# Altium footprint library Indruino.PcbLib: 383 footprints (part 14 of 24)
Each footprint in its own frame and in the unit in brackets; x right, y up, seen from the top. Pads: shape width x height; smd on the part's side, far side on the other; paste and mask are expansions set on the pad; w line width, h text height; cw(c..) or ccw(c..) is an arc to the next point about the centre after c.
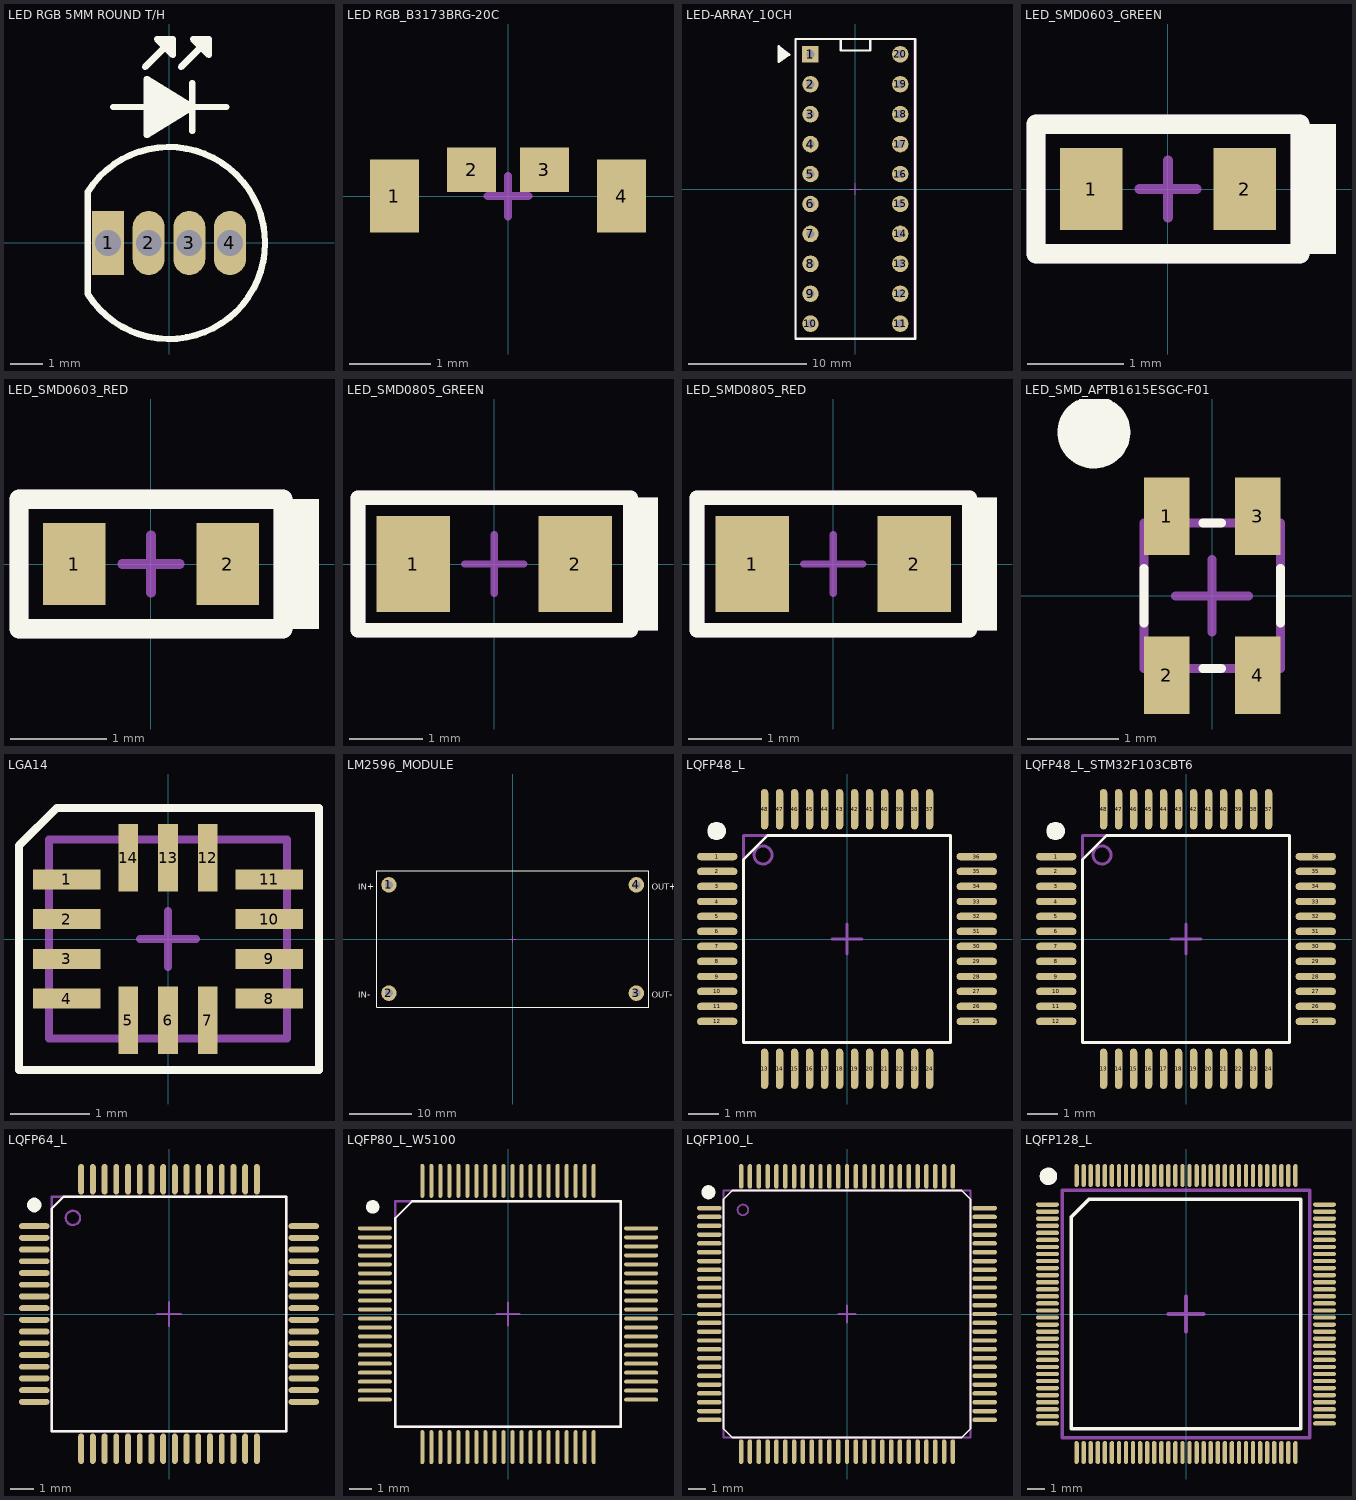
[diagram p13: the footprints below, top view; thin cyan lines are the x and y axes]

## LED RGB 5MM ROUND T/H [mm]
pads (4):
  rect 1x2 hole 0.8: 1(-1.905,0)
  oval 1x2 hole 0.8: 2(-0.635,0) 3(0.635,0) 4(1.905,0)
Top Overlay:
  region: 0.75,6.375 1.25,6.375 1.25,5.875
  region: 0.125,5.875 -0.375,6.375 0.125,6.375
  region: -0.689,3.375 0.725,4.25 -0.689,5.125
  lines w0.2: -2.541,-1.594 ccw(c0,0) -2.538,1.599 ; -2.54,-1.594 -2.54,1.599 ; -1.75,4.25 -0.689,4.25 ; -0.75,5.5 0.125,6.375 ; 0.375,5.5 1.25,6.375 ; 0.725,3.5 0.725,5 ; 1.786,4.25 0.725,4.25 ; 0.125,6.375 0.125,5.875 -0.375,6.375 0.125,6.375 ; 0.725,4.25 -0.689,5.125 -0.689,3.375 0.725,4.25 ; 1.25,6.375 0.75,6.375 1.25,5.875 1.25,6.375
3D body "WP154A4.STEP": height 13.6, standoff -19.5, extent -2.5,-2.95 2.95,2.95

## LED RGB_B3173BRG-20C [mm] "Harvatek, ARGB SMD Chip LED, Size 1204, Side View, Body 3.2x1.0x1.5mm,"
height 1
pads (4):
  rect 0.6x0.9 smd: 1(-1.4,0) 4(1.4,0)
  rect 0.6x0.55 smd: 2(-0.45,0.325) 3(0.45,0.325)
Mechanical 15:
  lines w0.1: -0.25,0 0.25,0 ; 0,-0.25 0,0.25
3D body "LED_HARVATEK_B3173BRG-20C.STEP": height 1, standoff 0, extent -1.7,-1.35 1.7,0.45

## LED-ARRAY_10CH [mm] "DIP, 20-Pin, Row Spacing 7.62 mm, Pitch 2.54 mm"
height 5.08
pads (20):
  rect 1.4x1.4 hole 0.7: 1(-3.81,11.43)
  round 1.4 hole 0.7: 2(-3.81,8.89) 3(-3.81,6.35) 4(-3.81,3.81) 5(-3.81,1.27) 6(-3.81,-1.27) 7(-3.81,-3.81) 8(-3.81,-6.35) 9(-3.81,-8.89) 10(-3.81,-11.43) 11(3.81,-11.43) 12(3.81,-8.89) 13(3.81,-6.35) 14(3.81,-3.81) 15(3.81,-1.27) 16(3.81,1.27) 17(3.81,3.81) 18(3.81,6.35) 19(3.81,8.89) 20(3.81,11.43)
Top Overlay:
  region: -6.5,12.1 -5.6,11.4 -6.5,10.8
  lines w0.2: -1.25,12.73 -1.25,11.75 1.25,11.75 1.25,12.73 ; -6.5,10.8 -6.5,12.1 -5.6,11.4 -6.5,10.8 ; -5.08,-12.7 5.08,-12.7 5.08,12.73 -5.08,12.73 -5.08,-12.7
Mechanical 1:
  lines w0.1: -5,-12.73 5,-12.73 5,12.73 -5,12.73 -5,-12.73
Mechanical 15:
  lines w0.1: -0.5,0 0.5,0 ; 0,-0.5 0,0.5
3D body "User Library-LED_BAR_10.step": height 11.8, standoff -2, extent -5.08,-12.7 5.08,12.7

## LED_SMD0603_GREEN [mm]
pads (2):
  rect 0.65x0.85 smd: 1(-0.8,0) 2(0.8,0)
Top Overlay:
  region: 1.75,0.675 1.375,0.675 1.375,-0.675 1.75,-0.675
  lines w0.2: -1.375,-0.675 -1.375,0.675 1.375,0.675 1.375,-0.675 -1.375,-0.675
Mechanical 13:
  region: 1.75,0.675 1.375,0.675 1.375,-0.675 1.75,-0.675
  lines w0.2: -1.375,-0.675 -1.375,0.675 1.375,0.675 1.375,-0.675 -1.375,-0.675
  text "'.Designator'" at -1.03,-0.397 h0.7
Mechanical 15:
  lines w0.1: -0.3,0 0.3,0 ; 0,-0.3 0,0.3
3D body "User Library-LTST-C190GKT.STEP": height 0.9, standoff 0, extent -0.85,-0.45 0.85,0.45

## LED_SMD0603_RED [mm]
pads (2):
  rect 0.65x0.85 smd: 1(-0.8,0) 2(0.8,0)
Top Overlay:
  region: 1.75,0.675 1.375,0.675 1.375,-0.675 1.75,-0.675
  lines w0.2: -1.375,-0.675 -1.375,0.675 1.375,0.675 1.375,-0.675 -1.375,-0.675
Mechanical 13:
  region: 1.75,0.675 1.375,0.675 1.375,-0.675 1.75,-0.675
  lines w0.2: -1.375,-0.675 -1.375,0.675 1.375,0.675 1.375,-0.675 -1.375,-0.675
  text "'.Designator'" at -1.03,-0.397 h0.7
Mechanical 15:
  lines w0.1: -0.3,0 0.3,0 ; 0,-0.3 0,0.3
3D body "User Library-LTST-C190EKT.STEP": height 0.9, standoff 0, extent -0.855,-0.45 0.845,0.45

## LED_SMD0805_GREEN [mm]
pads (2):
  rect 1x1.3 smd: 1(-1.1,0) 2(1.1,0)
Top Overlay:
  region: 2.225,0.9 1.85,0.9 1.85,-0.9 2.225,-0.9
  lines w0.2: -1.85,-0.9 1.85,-0.9 1.85,0.9 -1.85,0.9 -1.85,-0.9
Mechanical 13:
  region: 2.225,0.9 1.85,0.9 1.85,-0.9 2.225,-0.9
  lines w0.2: -1.85,-0.9 -1.85,0.9 1.85,0.9 1.85,-0.9 -1.85,-0.9
  text "'.Designator'" at -1.43,-0.297 h0.7
Mechanical 15:
  lines w0.1: -0.4,0 0.4,0 ; 0,-0.4 0,0.4
3D body "led_smd_2012_green.stp": height 0.9, standoff 0, extent -1.195,-0.75 1.205,0.75

## LED_SMD0805_RED [mm]
pads (2):
  rect 1x1.3 smd: 1(-1.1,0) 2(1.1,0)
Top Overlay:
  region: 2.225,0.9 1.85,0.9 1.85,-0.9 2.225,-0.9
  lines w0.2: -1.85,-0.9 -1.85,0.9 1.85,0.9 1.85,-0.9 -1.85,-0.9
Mechanical 13:
  region: 2.225,0.9 1.85,0.9 1.85,-0.9 2.225,-0.9
  lines w0.2: -1.85,-0.9 1.85,-0.9 1.85,0.9 -1.85,0.9 -1.85,-0.9
  text "'.Designator'" at -1.43,-0.297 h0.7
Mechanical 15:
  lines w0.1: -0.4,0 0.4,0 ; 0,-0.4 0,0.4
3D body "everlight-17-21-0805LED-red.step": height 1.12, standoff 0.01, extent -1,-0.625 1,0.625

## LED_SMD_APTB1615ESGC-F01 [mm] "1.6mmx1.5mm SMT LED, 0.7mm thickness."
height 0.45
pads (4):
  rect 0.5x0.85 smd: 1(-0.5,0.875) 2(-0.5,-0.875) 3(0.5,0.875) 4(0.5,-0.875)
Top Overlay:
  circle w0.4: c-1.3,1.8 r0.2
  lines w0.1: -0.75,-0.3 -0.75,0.3 ; -0.1,-0.8 0.1,-0.8 ; -0.1,0.8 0.1,0.8 ; 0.75,-0.3 0.75,0.3
Mechanical 15:
  lines w0.1: -0.4,0 0.4,0 ; 0,-0.4 0,0.4 ; -0.75,-0.8 0.75,-0.8 0.75,0.8 -0.75,0.8 -0.75,-0.8
3D body "APTB1615.STEP": height 0.68, standoff -0.02, extent -0.75,-0.8 0.75,0.8

## LGA14 [mm] "LGA14 LEAD 2.5x3x0.83mm"
height 0.83
pads (14):
  rect 0.85x0.25 smd: 1(-1.275,0.75) 2(-1.275,0.25) 3(-1.275,-0.25) 4(-1.275,-0.75) 8(1.275,-0.75) 9(1.275,-0.25) 10(1.275,0.25) 11(1.275,0.75)
  rect 0.25x0.85 smd: 5(-0.5,-1.025) 6(0,-1.025) 7(0.5,-1.025) 12(0.5,1.025) 13(0,1.025) 14(-0.5,1.025)
Top Overlay:
  lines w0.1: -1.875,-1.65 -1.875,1.175 -1.4,1.65 1.9,1.65 1.9,-1.65 -1.875,-1.65
Mechanical 13:
  lines w0.1: -1.5,-1.25 -1.5,1.25 1.5,1.25 1.5,-1.25 -1.5,-1.25
Mechanical 15:
  lines w0.1: -0.35,0 0.35,0 ; 0,-0.35 0,0.35
3D body: height 0.86, standoff 0, extent -1.5,-1.25 1.5,1.25

## LM2596_MODULE [mm]
pads (4):
  round 2.5 hole 1.3: 1(-20,8.75) 2(-20,-8.75) 3(20,-8.75) 4(20,8.75)
Top Overlay:
  lines w0.2: -22,-11 -22,11 22,11 22,-11 -22,-11
  text "OUT-" at 22.5,-9.5 h1
  text "OUT+" at 22.5,8 h1
  text "IN-" at -25,-9.5 h1
  text "IN+" at -25,8 h1
Mechanical 15:
  lines w0.1: -0.5,0 0.5,0 ; 0,-0.5 0,0.5
3D body: height 10, standoff 0, extent -22,-11 22,11

## LQFP48_L [mm] "Thin QFP, 48-Leads, Body 7x7mm, Pitch 0.5mm, IPC High Density"
height 1.6
pads (48):
  oval 1.35x0.25 smd: 1(-4.325,2.75) 2(-4.325,2.25) 3(-4.325,1.75) 4(-4.325,1.25) 5(-4.325,0.75) 6(-4.325,0.25) 7(-4.325,-0.25) 8(-4.325,-0.75) 9(-4.325,-1.25) 10(-4.325,-1.75) 11(-4.325,-2.25) 12(-4.325,-2.75) 25(4.325,-2.75) 26(4.325,-2.25) 27(4.325,-1.75) 28(4.325,-1.25) 29(4.325,-0.75) 30(4.325,-0.25) 31(4.325,0.25) 32(4.325,0.75) 33(4.325,1.25) 34(4.325,1.75) 35(4.325,2.25) 36(4.325,2.75)
  oval 0.25x1.35 smd: 13(-2.75,-4.325) 14(-2.25,-4.325) 15(-1.75,-4.325) 16(-1.25,-4.325) 17(-0.75,-4.325) 18(-0.25,-4.325) 19(0.25,-4.325) 20(0.75,-4.325) 21(1.25,-4.325) 22(1.75,-4.325) 23(2.25,-4.325) 24(2.75,-4.325) 37(2.75,4.325) 38(2.25,4.325) 39(1.75,4.325) 40(1.25,4.325) 41(0.75,4.325) 42(0.25,4.325) 43(-0.25,4.325) 44(-0.75,4.325) 45(-1.25,4.325) 46(-1.75,4.325) 47(-2.25,4.325) 48(-2.75,4.325)
Top Overlay:
  region: -4.35,3.3 -4.41,3.3 -4.52,3.346 -4.604,3.43 -4.65,3.54 -4.65,3.6 -4.65,3.66 -4.604,3.77 -4.52,3.854 -4.41,3.9 -4.35,3.9 -4.29,3.9 -4.18,3.854 -4.096,3.77 -4.05,3.66 -4.05,3.6 -4.05,3.54 -4.096,3.43 -4.18,3.346 -4.29,3.3
  lines w0.1: -3.45,-3.45 -3.45,2.65 -2.65,3.45 3.45,3.45 3.45,-3.45 -3.45,-3.45
Mechanical 13:
  circle w0.1: c-2.8,2.8 r0.3
  lines w0.1: -3.45,-3.45 -3.45,3.45 3.45,3.45 3.45,-3.45 -3.45,-3.45
Mechanical 15:
  lines w0.1: -0.5,0 0.5,0 ; 0,-0.5 0,0.5
3D body "User Library-LQFP48-0_5.STEP": height 1.6, standoff 0.03, extent -4.392,-4.382 4.38,4.39

## LQFP48_L_STM32F103CBT6 [mm] "Thin QFP, 48-Leads, Body 7x7mm, Pitch 0.5mm, IPC High Density"
height 1.6
pads (48):
  oval 1.35x0.25 smd: 1(-4.325,2.75) 2(-4.325,2.25) 3(-4.325,1.75) 4(-4.325,1.25) 5(-4.325,0.75) 6(-4.325,0.25) 7(-4.325,-0.25) 8(-4.325,-0.75) 9(-4.325,-1.25) 10(-4.325,-1.75) 11(-4.325,-2.25) 12(-4.325,-2.75) 25(4.325,-2.75) 26(4.325,-2.25) 27(4.325,-1.75) 28(4.325,-1.25) 29(4.325,-0.75) 30(4.325,-0.25) 31(4.325,0.25) 32(4.325,0.75) 33(4.325,1.25) 34(4.325,1.75) 35(4.325,2.25) 36(4.325,2.75)
  oval 0.25x1.35 smd: 13(-2.75,-4.325) 14(-2.25,-4.325) 15(-1.75,-4.325) 16(-1.25,-4.325) 17(-0.75,-4.325) 18(-0.25,-4.325) 19(0.25,-4.325) 20(0.75,-4.325) 21(1.25,-4.325) 22(1.75,-4.325) 23(2.25,-4.325) 24(2.75,-4.325) 37(2.75,4.325) 38(2.25,4.325) 39(1.75,4.325) 40(1.25,4.325) 41(0.75,4.325) 42(0.25,4.325) 43(-0.25,4.325) 44(-0.75,4.325) 45(-1.25,4.325) 46(-1.75,4.325) 47(-2.25,4.325) 48(-2.75,4.325)
Top Overlay:
  region: -4.35,3.3 -4.41,3.3 -4.52,3.346 -4.604,3.43 -4.65,3.54 -4.65,3.6 -4.65,3.66 -4.604,3.77 -4.52,3.854 -4.41,3.9 -4.35,3.9 -4.29,3.9 -4.18,3.854 -4.096,3.77 -4.05,3.66 -4.05,3.6 -4.05,3.54 -4.096,3.43 -4.18,3.346 -4.29,3.3
  lines w0.1: -3.45,-3.45 -3.45,2.65 -2.65,3.45 3.45,3.45 3.45,-3.45 -3.45,-3.45
Mechanical 13:
  circle w0.1: c-2.8,2.8 r0.3
  lines w0.1: -3.45,-3.45 -3.45,3.45 3.45,3.45 3.45,-3.45 -3.45,-3.45
Mechanical 15:
  lines w0.1: -0.5,0 0.5,0 ; 0,-0.5 0,0.5
3D body "STM32 LQFP48.step": height 1.5, standoff 0, extent -4.5,-4.509 4.518,4.509

## LQFP64_L [mm]
pads (64):
  oval 1.3x0.25 smd: 1(-5.75,3.75) 2(-5.75,3.25) 3(-5.75,2.75) 4(-5.75,2.25) 5(-5.75,1.75) 6(-5.75,1.25) 7(-5.75,0.75) 8(-5.75,0.25) 9(-5.75,-0.25) 10(-5.75,-0.75) 11(-5.75,-1.25) 12(-5.75,-1.75) 13(-5.75,-2.25) 14(-5.75,-2.75) 15(-5.75,-3.25) 16(-5.75,-3.75) 33(5.75,-3.75) 34(5.75,-3.25) 35(5.75,-2.75) 36(5.75,-2.25) 37(5.75,-1.75) 38(5.75,-1.25) 39(5.75,-0.75) 40(5.75,-0.25) 41(5.75,0.25) 42(5.75,0.75) 43(5.75,1.25) 44(5.75,1.75) 45(5.75,2.25) 46(5.75,2.75) 47(5.75,3.25) 48(5.75,3.75)
  oval 0.25x1.3 smd: 17(-3.75,-5.75) 18(-3.25,-5.75) 19(-2.75,-5.75) 20(-2.25,-5.75) 21(-1.75,-5.75) 22(-1.25,-5.75) 23(-0.75,-5.75) 24(-0.25,-5.75) 25(0.25,-5.75) 26(0.75,-5.75) 27(1.25,-5.75) 28(1.75,-5.75) 29(2.25,-5.75) 30(2.75,-5.75) 31(3.25,-5.75) 32(3.75,-5.75) 49(3.75,5.75) 50(3.25,5.75) 51(2.75,5.75) 52(2.25,5.75) 53(1.75,5.75) 54(1.25,5.75) 55(0.75,5.75) 56(0.25,5.75) 57(-0.25,5.75) 58(-0.75,5.75) 59(-1.25,5.75) 60(-1.75,5.75) 61(-2.25,5.75) 62(-2.75,5.75) 63(-3.25,5.75) 64(-3.75,5.75)
Top Overlay:
  region: -5.75,4.35 -5.81,4.35 -5.92,4.396 -6.004,4.48 -6.05,4.59 -6.05,4.65 -6.05,4.71 -6.004,4.82 -5.92,4.904 -5.81,4.95 -5.75,4.95 -5.69,4.95 -5.58,4.904 -5.496,4.82 -5.45,4.71 -5.45,4.65 -5.45,4.59 -5.496,4.48 -5.58,4.396 -5.69,4.35
  lines w0.1: -5,-5 -5,4.5 -4.5,5 5,5 5,-5 -5,-5
Mechanical 13:
  circle w0.1: c-4.1,4.1 r0.304
  lines w0.1: -5,-5 5,-5 5,5 -5,5 -5,-5
Mechanical 15:
  lines w0.1: -0.5,0 0.5,0 ; 0,-0.5 0,0.5
3D body "User Library-LQFP64-0_5.STEP": height 1.6, standoff 0.03, extent -5.896,-5.896 5.876,5.876

## LQFP80_L_W5100 [mm]
pads (80):
  oval 1.5x0.18 smd: 1(-5.9,3.8) 2(-5.9,3.4) 3(-5.9,3) 4(-5.9,2.6) 5(-5.9,2.2) 6(-5.9,1.8) 7(-5.9,1.4) 8(-5.9,1) 9(-5.9,0.6) 10(-5.9,0.2) 11(-5.9,-0.2) 12(-5.9,-0.6) 13(-5.9,-1) 14(-5.9,-1.4) 15(-5.9,-1.8) 16(-5.9,-2.2) 17(-5.9,-2.6) 18(-5.9,-3) 19(-5.9,-3.4) 20(-5.9,-3.8) 41(5.9,-3.8) 42(5.9,-3.4) 43(5.9,-3) 44(5.9,-2.6) 45(5.9,-2.2) 46(5.9,-1.8) 47(5.9,-1.4) 48(5.9,-1) 49(5.9,-0.6) 50(5.9,-0.2) 51(5.9,0.2) 52(5.9,0.6) 53(5.9,1) 54(5.9,1.4) 55(5.9,1.8) 56(5.9,2.2) 57(5.9,2.6) 58(5.9,3) 59(5.9,3.4) 60(5.9,3.8)
  oval 0.18x1.5 smd: 21(-3.8,-5.9) 22(-3.4,-5.9) 23(-3,-5.9) 24(-2.6,-5.9) 25(-2.2,-5.9) 26(-1.8,-5.9) 27(-1.4,-5.9) 28(-1,-5.9) 29(-0.6,-5.9) 30(-0.2,-5.9) 31(0.2,-5.9) 32(0.6,-5.9) 33(1,-5.9) 34(1.4,-5.9) 35(1.8,-5.9) 36(2.2,-5.9) 37(2.6,-5.9) 38(3,-5.9) 39(3.4,-5.9) 40(3.8,-5.9) 61(3.8,5.9) 62(3.4,5.9) 63(3,5.9) 64(2.6,5.9) 65(2.2,5.9) 66(1.8,5.9) 67(1.4,5.9) 68(1,5.9) 69(0.6,5.9) 70(0.2,5.9) 71(-0.2,5.9) 72(-0.6,5.9) 73(-1,5.9) 74(-1.4,5.9) 75(-1.8,5.9) 76(-2.2,5.9) 77(-2.6,5.9) 78(-3,5.9) 79(-3.4,5.9) 80(-3.8,5.9)
Top Overlay:
  circle w0.2: c-6,4.75 r0.2
  region: -6,4.55 -6.04,4.55 -6.113,4.58 -6.17,4.637 -6.2,4.71 -6.2,4.75 -6.2,4.79 -6.17,4.863 -6.113,4.92 -6.04,4.95 -6,4.95 -5.96,4.95 -5.887,4.92 -5.83,4.863 -5.8,4.79 -5.8,4.75 -5.8,4.71 -5.83,4.637 -5.887,4.58 -5.96,4.55
  lines w0.1: -5,-5 -5,4.25 -4.25,5 5,5 5,-5 -5,-5
Mechanical 13:
  lines w0.1: -5,-5 -5,5 5,5 5,-5 -5,-5
Mechanical 15:
  lines w0.1: -0.5,0 0.5,0 ; 0,-0.5 0,0.5
3D body "User Library-LQFP-80-2.step": height 1.75, standoff 0, extent -6,-6.002 6.005,6.002

## LQFP100_L [mm] "Thin QFP, 100-Leads, Body 14x14mm, Pitch 0.5mm, IPC High Density"
height 1.6
pads (100):
  oval 1.4x0.25 smd: 1(-7.8,6) 2(-7.8,5.5) 3(-7.8,5) 4(-7.8,4.5) 5(-7.8,4) 6(-7.8,3.5) 7(-7.8,3) 8(-7.8,2.5) 9(-7.8,2) 10(-7.8,1.5) 11(-7.8,1) 12(-7.8,0.5) 13(-7.8,0) 14(-7.8,-0.5) 15(-7.8,-1) 16(-7.8,-1.5) 17(-7.8,-2) 18(-7.8,-2.5) 19(-7.8,-3) 20(-7.8,-3.5) 21(-7.8,-4) 22(-7.8,-4.5) 23(-7.8,-5) 24(-7.8,-5.5) 25(-7.8,-6) 51(7.8,-6) 52(7.8,-5.5) 53(7.8,-5) 54(7.8,-4.5) 55(7.8,-4) 56(7.8,-3.5) 57(7.8,-3) 58(7.8,-2.5) 59(7.8,-2) 60(7.8,-1.5) 61(7.8,-1) 62(7.8,-0.5) 63(7.8,0) 64(7.8,0.5) 65(7.8,1) 66(7.8,1.5) 67(7.8,2) 68(7.8,2.5) 69(7.8,3) 70(7.8,3.5) 71(7.8,4) 72(7.8,4.5) 73(7.8,5) 74(7.8,5.5) 75(7.8,6)
  oval 0.25x1.4 smd: 26(-6,-7.8) 27(-5.5,-7.8) 28(-5,-7.8) 29(-4.5,-7.8) 30(-4,-7.8) 31(-3.5,-7.8) 32(-3,-7.8) 33(-2.5,-7.8) 34(-2,-7.8) 35(-1.5,-7.8) 36(-1,-7.8) 37(-0.5,-7.8) 38(0,-7.8) 39(0.5,-7.8) 40(1,-7.8) 41(1.5,-7.8) 42(2,-7.8) 43(2.5,-7.8) 44(3,-7.8) 45(3.5,-7.8) 46(4,-7.8) 47(4.5,-7.8) 48(5,-7.8) 49(5.5,-7.8) 50(6,-7.8) 76(6,7.8) 77(5.5,7.8) 78(5,7.8) 79(4.5,7.8) 80(4,7.8) 81(3.5,7.8) 82(3,7.8) 83(2.5,7.8) 84(2,7.8) 85(1.5,7.8) 86(1,7.8) 87(0.5,7.8) 88(0,7.8) 89(-0.5,7.8) 90(-1,7.8) 91(-1.5,7.8) 92(-2,7.8) 93(-2.5,7.8) 94(-3,7.8) 95(-3.5,7.8) 96(-4,7.8) 97(-4.5,7.8) 98(-5,7.8) 99(-5.5,7.8) 100(-6,7.8)
Top Overlay:
  circle w0.2: c-7.85,6.9 r0.3
  region: -7.85,6.6 -7.91,6.6 -8.02,6.646 -8.104,6.73 -8.15,6.84 -8.15,6.9 -8.15,6.96 -8.104,7.07 -8.02,7.154 -7.91,7.2 -7.85,7.2 -7.79,7.2 -7.68,7.154 -7.596,7.07 -7.55,6.96 -7.55,6.9 -7.55,6.84 -7.596,6.73 -7.68,6.646 -7.79,6.6
  lines w0.1: -7,-6.5 -7,6.5 -6.5,7 6.5,7 7,6.5 7,-6.5 6.5,-7 -6.5,-7 -7,-6.5
Mechanical 13:
  circle w0.1: c-5.9,5.9 r0.3
  lines w0.1: -7,-7 -7,7 7,7 7,-7 -7,-7
Mechanical 15:
  lines w0.1: -0.5,0 0.5,0 ; 0,-0.5 0,0.5
3D body "ATMEGA 2560.STEP": height 1.01, standoff -0.1, extent -8,-8 8,8

## LQFP128_L [mm] "LQFP-128 package. 0.4 mm pitch 14x14mm body"
pads (128):
  oval 1.3x0.246 smd: 1(-7.85,6.2) 2(-7.85,5.8) 3(-7.85,5.4) 4(-7.85,5) 5(-7.85,4.6) 6(-7.85,4.2) 7(-7.85,3.8) 8(-7.85,3.4) 9(-7.85,3) 10(-7.85,2.6) 11(-7.85,2.2) 12(-7.85,1.8) 13(-7.85,1.4) 14(-7.85,1) 15(-7.85,0.6) 16(-7.85,0.2) 17(-7.85,-0.2) 18(-7.85,-0.6) 19(-7.85,-1) 20(-7.85,-1.4) 21(-7.85,-1.8) 22(-7.85,-2.2) 23(-7.85,-2.6) 24(-7.85,-3) 25(-7.85,-3.4) 26(-7.85,-3.8) 27(-7.85,-4.2) 28(-7.85,-4.6) 29(-7.85,-5) 30(-7.85,-5.4) 31(-7.85,-5.8) 32(-7.85,-6.2) 65(7.85,-6.2) 66(7.85,-5.8) 67(7.85,-5.4) 68(7.85,-5) 69(7.85,-4.6) 70(7.85,-4.2) 71(7.85,-3.8) 72(7.85,-3.4) 73(7.85,-3) 74(7.85,-2.6) 75(7.85,-2.2) 76(7.85,-1.8) 77(7.85,-1.4) 78(7.85,-1) 79(7.85,-0.6) 80(7.85,-0.2) 81(7.85,0.2) 82(7.85,0.6) 83(7.85,1) 84(7.85,1.4) 85(7.85,1.8) 86(7.85,2.2) 87(7.85,2.6) 88(7.85,3) 89(7.85,3.4) 90(7.85,3.8) 91(7.85,4.2) 92(7.85,4.6) 93(7.85,5) 94(7.85,5.4) 95(7.85,5.8) 96(7.85,6.2)
  oval 0.246x1.3 smd: 33(-6.2,-7.85) 34(-5.8,-7.85) 35(-5.4,-7.85) 36(-5,-7.85) 37(-4.6,-7.85) 38(-4.2,-7.85) 39(-3.8,-7.85) 40(-3.4,-7.85) 41(-3,-7.85) 42(-2.6,-7.85) 43(-2.2,-7.85) 44(-1.8,-7.85) 45(-1.4,-7.85) 46(-1,-7.85) 47(-0.6,-7.85) 48(-0.2,-7.85) 49(0.2,-7.85) 50(0.6,-7.85) 51(1,-7.85) 52(1.4,-7.85) 53(1.8,-7.85) 54(2.2,-7.85) 55(2.6,-7.85) 56(3,-7.85) 57(3.4,-7.85) 58(3.8,-7.85) 59(4.2,-7.85) 60(4.6,-7.85) 61(5,-7.85) 62(5.4,-7.85) 63(5.8,-7.85) 64(6.2,-7.85) 97(6.2,7.85) 98(5.8,7.85) 99(5.4,7.85) 100(5,7.85) 101(4.6,7.85) 102(4.2,7.85) 103(3.8,7.85) 104(3.4,7.85) 105(3,7.85) 106(2.6,7.85) 107(2.2,7.85) 108(1.8,7.85) 109(1.4,7.85) 110(1,7.85) 111(0.6,7.85) 112(0.2,7.85) 113(-0.2,7.85) 114(-0.6,7.85) 115(-1,7.85) 116(-1.4,7.85) 117(-1.8,7.85) 118(-2.2,7.85) 119(-2.6,7.85) 120(-3,7.85) 121(-3.4,7.85) 122(-3.8,7.85) 123(-4.2,7.85) 124(-4.6,7.85) 125(-5,7.85) 126(-5.4,7.85) 127(-5.8,7.85) 128(-6.2,7.85)
Top Overlay:
  circle w0.2: c-7.8,7.8 r0.4
  region: -7.8,7.4 -7.88,7.4 -8.027,7.461 -8.139,7.573 -8.2,7.72 -8.2,7.8 -8.2,7.88 -8.139,8.027 -8.027,8.139 -7.88,8.2 -7.8,8.2 -7.72,8.2 -7.573,8.139 -7.461,8.027 -7.4,7.88 -7.4,7.8 -7.4,7.72 -7.461,7.573 -7.573,7.461 -7.72,7.4
  lines w0.2: -6.5,-6.5 -6.5,5.5 -5.5,6.5 6.5,6.5 6.5,-6.5 -6.5,-6.5
Mechanical 13:
  lines w0.2: -7,-7 7,-7 7,7 -7,7 -7,-7
Mechanical 15:
  lines w0.2: -1,0 1,0 ; 0,-1 0,1
3D body "User Library-LQFP-128.STEP": height 1.35, standoff 0, extent -8,-8 8,8